# Altium footprint library 常用连接件.PcbLib: 38 footprints (part 3 of 3)
Each footprint in its own frame and in the unit in brackets; x right, y up, seen from the top. Pads: shape width x height; smd on the part's side, far side on the other; paste and mask are expansions set on the pad; w line width, h text height; cw(c..) or ccw(c..) is an arc to the next point about the centre after c.
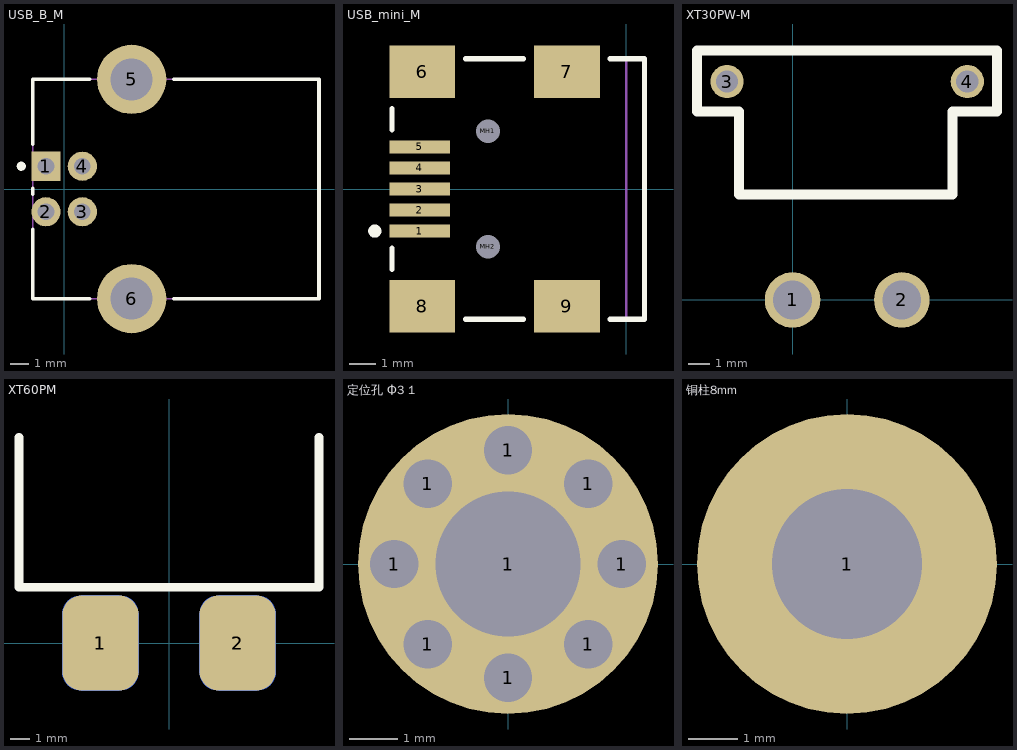
[diagram p2: the footprints below, top view; thin cyan lines are the x and y axes]

## USB_B_M [mm] "B型USB 母头"
height 11.5
pads (6):
  rect 1.6x1.6 hole 0.92: 1(-1,1.25)
  round 1.6 hole 0.92: 2(-1,-1.25) 3(1,-1.25) 4(1,1.25)
  round 3.8 hole 2.3: 5(3.71,6.02) 6(3.71,-6.02)
Top Overlay:
  circle w0.25: c-2.35,1.25 r0.125
  lines w0.2: -1.72,-2.21 -1.72,-6.02 1.41,-6.02 ; -1.72,-0.29 -1.72,0.05 ; -1.72,2.45 -1.72,6.02 1.41,6.02 ; 6.01,-6.02 13.99,-6.02 13.99,6.02 6.01,6.02
Mechanical 13:
  lines w0.1: -1.72,-6.02 -1.72,6.02 13.99,6.02 13.99,-6.02 -1.72,-6.02
3D body "Samtec3dPS-USB-B.STEP": height 10.53, standoff -3.69, extent -2.003,-7.455 14.297,7.404

## USB_mini_M [mm] "Mini-USB 母头"
height 3.9
pads (11):
  rect 2.3x0.5 smd: 1(-7.85,-1.6) 2(-7.85,-0.8) 3(-7.85,0) 4(-7.85,0.8) 5(-7.85,1.6)
  rect 2.5x2 smd: 6(-7.75,4.45) 7(-2.25,4.45) 8(-7.75,-4.45) 9(-2.25,-4.45)
  round 0.6 hole 0.9 unplated: MH1(-5.25,2.2) MH2(-5.25,-2.2)
Top Overlay:
  circle w0.25: c-9.55,-1.6 r0.125
  lines w0.2: -8.9,-3.05 -8.9,-2.25 ; -8.9,2.25 -8.9,3.05 ; -6.1,-4.95 -3.9,-4.95 ; -6.1,4.95 -3.9,4.95 ; -0.6,-4.95 0.7,-4.95 0.7,4.95 -0.6,4.95
Mechanical 1:
  lines w0.1: 0,-4.95 0,4.95
  text "PCB Edge" at 0.432,-4.036 h0.25
3D body "SW3dPS-USB_mini_B.STEP": height 3.95, standoff -1, extent -8.558,-5.35 0.642,5.35

## XT30PW-M [mil]
pads (4):
  round 100 hole 70: 1(0,0) 2(196.85,0)
  round 60 hole 40: 3(-118.11,393.7) 4(314.96,393.7)
Top Overlay:
  lines w18: -172.2,340 -172.2,450 368.43,450 368.43,340 288.43,340 288.43,190 -96.57,190 -96.57,340 -172.2,340
3D body "User Library-XT30- curved.step": height 204.72, standoff -74.8, extent -163.39,-34.67 360.24,556.1

## XT60PM [mm]
pads (4):
  rrect50% 4x5 smd: 1(-3.6,0) 2(3.6,0)
  rrect50% 4x5 smd far side: 1(-3.6,0) 2(3.6,0)
Top Overlay:
  lines w0.457: -7.874,10.795 -7.874,2.921 7.874,2.921 7.874,10.795
3D body "User Library-XT60PM.step": height 3.45, standoff -4.65, extent -9.25,0.508 9.25,14.208

## 定位孔 Φ3 1 [mm]
pads (9):
  round 1 hole 1: 1(-2.35,0) 1(-1.662,-1.662) 1(-1.662,1.662) 1(0,-2.35) 1(0,2.35) 1(1.662,-1.662) 1(1.662,1.662) 1(2.35,0)
  round 6.2 hole 3: 1(0,0)

## 铜柱8mm [mil]
pads (1):
  round 240 hole 120: 1(0,0)
3D body "ͭ?": height -10.58, standoff -323.95, extent -122.76,-141.74 122.74,141.75